# Altium footprint library lib_protel_HC_BOINA.PCBLIB: 726 footprints (part 44 of 46)
Each footprint in its own frame and in the unit in brackets; x right, y up, seen from the top. Pads: shape width x height; smd on the part's side, far side on the other; paste and mask are expansions set on the pad; w line width, h text height; cw(c..) or ccw(c..) is an arc to the next point about the centre after c.
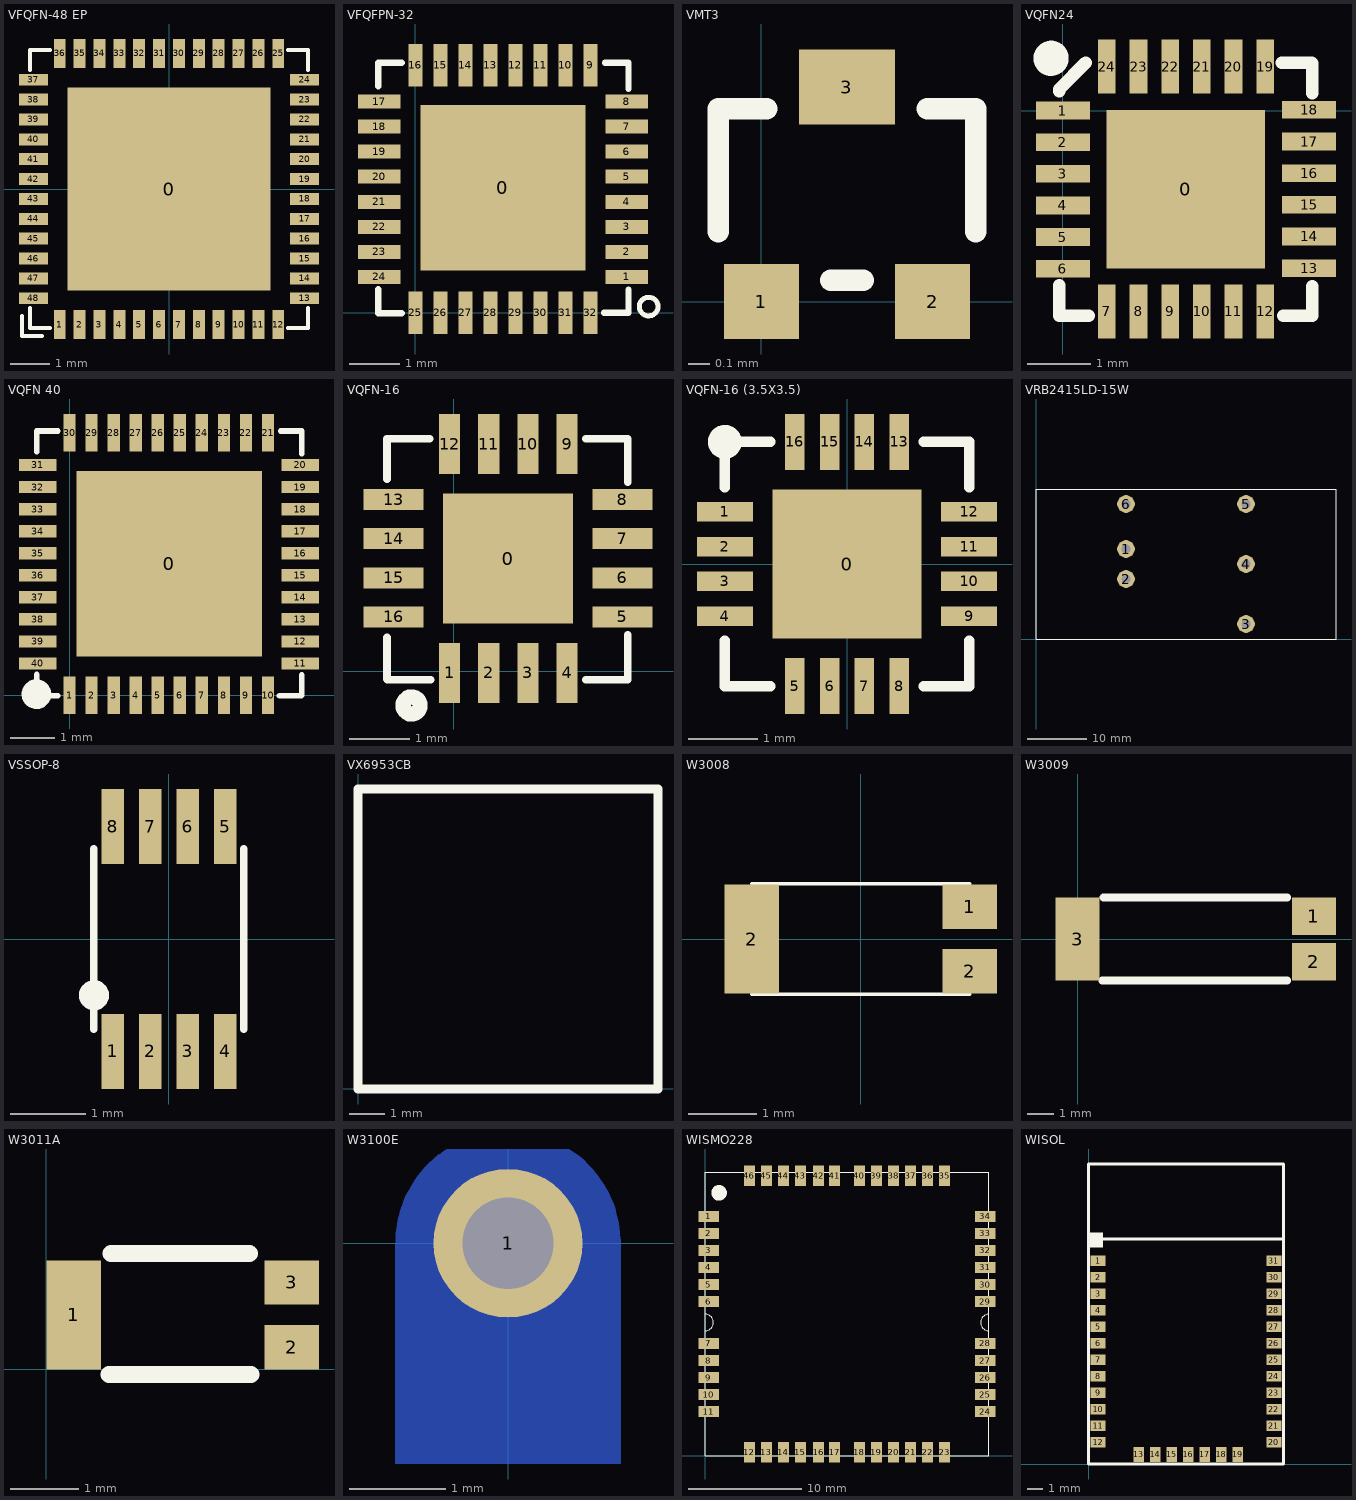
[diagram p43: the footprints below, top view; thin cyan lines are the x and y axes]

## VFQFN-48 EP [mm]
pads (49):
  rect 5.1x5.1 smd: 0(0,0)
  rect 0.3x0.725 smd: 1(-2.75,-3.413) 2(-2.25,-3.413) 3(-1.75,-3.413) 4(-1.25,-3.413) 5(-0.75,-3.413) 6(-0.25,-3.413) 7(0.25,-3.413) 8(0.75,-3.413) 9(1.25,-3.413) 10(1.75,-3.413) 11(2.25,-3.413) 12(2.75,-3.413) 25(2.75,3.413) 26(2.25,3.413) 27(1.75,3.413) 28(1.25,3.413) 29(0.75,3.413) 30(0.25,3.413) 31(-0.25,3.413) 32(-0.75,3.413) 33(-1.25,3.413) 34(-1.75,3.413) 35(-2.25,3.413) 36(-2.75,3.413)
  rect 0.725x0.3 smd: 13(3.413,-2.75) 14(3.413,-2.25) 15(3.413,-1.75) 16(3.413,-1.25) 17(3.413,-0.75) 18(3.413,-0.25) 19(3.413,0.25) 20(3.413,0.75) 21(3.413,1.25) 22(3.413,1.75) 23(3.413,2.25) 24(3.413,2.75) 37(-3.413,2.75) 38(-3.413,2.25) 39(-3.413,1.75) 40(-3.413,1.25) 41(-3.413,0.75) 42(-3.413,0.25) 43(-3.413,-0.25) 44(-3.413,-0.75) 45(-3.413,-1.25) 46(-3.413,-1.75) 47(-3.413,-2.25) 48(-3.413,-2.75)
Top Overlay:
  lines w0.1: -3.7,-3.2 -3.7,-3.7 -3.2,-3.7 ; -3.5,-3 -3.5,-3.5 -3,-3.5 ; -3.5,3 -3.5,3.5 -3,3.5 ; 3,-3.5 3.5,-3.5 3.5,-3 ; 3,3.5 3.5,3.5 3.5,3

## VFQFPN-32 [mm] "STRFNFCA"
height 1
pads (33):
  rect 3.3x3.3 smd: 0(1.75,2.5)
  rect 0.85x0.28 smd mask+0.07: 1(4.23,0.72) 2(4.23,1.22) 3(4.23,1.72) 4(4.23,2.22) 5(4.23,2.72) 6(4.23,3.22) 7(4.23,3.72) 8(4.23,4.22) 17(-0.72,4.22) 18(-0.72,3.72) 19(-0.72,3.22) 20(-0.72,2.72) 21(-0.72,2.22) 22(-0.72,1.72) 23(-0.72,1.22) 24(-0.72,0.72)
  rect 0.28x0.85 smd mask+0.07: 9(3.5,4.95) 10(3,4.95) 11(2.5,4.95) 12(2,4.95) 13(1.5,4.95) 14(1,4.95) 15(0.5,4.95) 16(0,4.95) 25(0,0) 26(0.5,0) 27(1,0) 28(1.5,0) 29(2,0) 30(2.5,0) 31(3,0) 32(3.5,0)
Top Overlay:
  circle w0.1: c4.663,0.125 r0.187
  lines w0.127: -0.74,0.47 -0.74,-0.01 -0.27,-0.01 ; -0.74,4.525 -0.74,4.995 ; -0.74,5 -0.27,5 ; 3.77,0 4.26,0 4.26,0.46 ; 3.79,4.995 4.26,4.995 4.26,4.475

## VMT3 [mm]
pads (3):
  rect 0.35x0.35 smd: 1(0,0) 2(0.8,0)
  rect 0.45x0.35 smd: 3(0.4,1)
Top Overlay:
  lines w0.1: -0.2,0.325 -0.2,0.9 0.025,0.9 ; 0.325,0.1 0.475,0.1 ; 0.775,0.9 1,0.9 1,0.325
3D body: height 0.5, standoff 0, extent -0.2,0.1 1,0.9

## VQFN24 [mm] "encapsulado para BQ24610"
height 1
pads (25):
  rect 2.5x2.5 smd mask+0: 0(1.94,-1.245)
  rect 0.85x0.28 smd: 1(0,0) 2(0,-0.5) 3(0,-1) 4(0,-1.5) 5(0,-2) 6(0,-2.5) 13(3.89,-2.49) 14(3.89,-1.99) 15(3.89,-1.49) 16(3.89,-0.99) 17(3.89,-0.49) 18(3.89,0.01)
  rect 0.28x0.85 smd: 7(0.695,-3.175) 8(1.195,-3.175) 9(1.695,-3.175) 10(2.195,-3.175) 11(2.695,-3.175) 12(3.195,-3.175) 19(3.195,0.695) 20(2.695,0.695) 21(2.195,0.695) 22(1.695,0.695) 23(1.195,0.695) 24(0.695,0.695)
Top Overlay:
  circle w0.381: c-0.187,0.825 r0.087
  lines w0.2: -0.06,-2.765 -0.06,-3.245 0.41,-3.245 ; -0.06,0.305 -0.06,0.335 0.36,0.755 ; 3.46,0.755 3.93,0.755 3.94,0.745 3.94,0.275 ; 3.48,-3.245 3.94,-3.245 3.94,-2.775

## VQFN 40 [mm] "CC2530"
height 1
pads (41):
  rect 4.2x4.2 smd: 0(2.26,2.98)
  rect 0.28x0.85 smd: 1(0,0) 2(0.5,0) 3(1,0) 4(1.5,0) 5(2,0) 6(2.5,0) 7(3,0) 8(3.5,0) 9(4,0) 10(4.5,0) 21(4.5,5.95) 22(4,5.95) 23(3.5,5.95) 24(3,5.95) 25(2.5,5.95) 26(2,5.95) 27(1.5,5.95) 28(1,5.95) 29(0.5,5.95) 30(0,5.95)
  rect 0.85x0.28 smd: 11(5.23,0.72) 12(5.23,1.22) 13(5.23,1.72) 14(5.23,2.22) 15(5.23,2.72) 16(5.23,3.22) 17(5.23,3.72) 18(5.23,4.22) 19(5.23,4.72) 20(5.23,5.22) 31(-0.72,5.22) 32(-0.72,4.72) 33(-0.72,4.22) 34(-0.72,3.72) 35(-0.72,3.22) 36(-0.72,2.72) 37(-0.72,2.22) 38(-0.72,1.72) 39(-0.72,1.22) 40(-0.72,0.72)
Top Overlay:
  circle w0.3: c-0.75,0.025 r0.187
  lines w0.127: -0.74,0.47 -0.74,-0.01 -0.27,-0.01 ; -0.74,5.52 -0.74,5.99 -0.27,5.99 ; 4.76,-0.01 5.25,-0.01 5.26,0 5.26,0.46 ; 4.79,5.99 5.26,5.99 5.26,5.47
3D body "User Library-QFN-40.STEP": height 1.05, standoff 0, extent -0.825,-0.1 5.325,6.05

## VQFN-16 [mm] "AMPLIFICADOR CC2591"
height 1
pads (17):
  rect 2.16x2.16 smd: 0(0.9,1.87)
  rect 0.35x1 smd mask+0.07: 1(-0.07,-0.03) 2(0.58,-0.03) 3(1.23,-0.03) 4(1.88,-0.03) 9(1.88,3.77) 10(1.23,3.77) 11(0.58,3.77) 12(-0.07,3.77)
  rect 1x0.35 smd mask+0.07: 5(2.8,0.9) 6(2.8,1.55) 7(2.8,2.2) 8(2.8,2.85) 13(-1,2.85) 14(-1,2.2) 15(-1,1.55) 16(-1,0.9)
Top Overlay:
  circle w0.254: c-0.701,-0.57 r0.141
  lines w0.127: -1.11,0.56 -1.11,-0.13 -1.1,-0.14 -0.38,-0.14 ; -1.11,3.19 -1.11,3.86 -0.4,3.86 ; 2.19,-0.14 2.89,-0.14 2.89,0.6 ; 2.19,3.86 2.89,3.86 2.89,3.14

## VQFN-16 (3.5X3.5) [mm]
height 0.9
pads (17):
  rect 2.14x2.14 smd mask+0.06: 0(0,0)
  rect 0.8x0.28 smd mask+0.06: 1(-1.75,0.75) 2(-1.75,0.25) 3(-1.75,-0.25) 4(-1.75,-0.75) 9(1.75,-0.75) 10(1.75,-0.25) 11(1.75,0.25) 12(1.75,0.75)
  rect 0.28x0.8 smd mask+0.06: 5(-0.75,-1.75) 6(-0.25,-1.75) 7(0.25,-1.75) 8(0.75,-1.75) 13(0.75,1.75) 14(0.25,1.75) 15(-0.25,1.75) 16(-0.75,1.75)
Top Overlay:
  circle w0.305: c-1.75,1.75 r0.09
  lines w0.15: -1.75,-1.1 -1.75,-1.75 -1.1,-1.75 ; -1.75,1.1 -1.75,1.75 -1.1,1.75 ; 1.1,-1.75 1.75,-1.75 1.75,-1.1 ; 1.1,1.75 1.75,1.75 1.75,1.1
3D body: height 0.9, standoff 0, extent -1.75,-1.75 1.75,1.75

## VRB2415LD-15W [mm]
pads (6):
  round 3 hole 1.5: 1(15.24,15.24) 2(15.24,10.16) 3(35.56,2.54) 4(35.56,12.7) 5(35.56,22.86) 6(15.24,22.86)
Top Overlay:
  lines w0.203: 0,0 50.8,0 50.8,25.4 0,25.4 0,0

## VSSOP-8 [mm]
pads (8):
  rect 0.3x1 smd: 1(-0.75,-1.5) 2(-0.25,-1.5) 3(0.25,-1.5) 4(0.75,-1.5) 5(0.75,1.5) 6(0.25,1.5) 7(-0.25,1.5) 8(-0.75,1.5)
Top Overlay:
  circle w0.203: c-1,-0.75 r0.1
  lines w0.1: -1,-1.2 -1,1.2 ; 1,-1.2 1,1.2

## VX6953CB [mm] "CAMARA"
height 4.6
Top Overlay:
  lines w0.254: 0,0 0,8.5 8.5,8.5 8.5,0 0.025,0 0,0.025

## W3008 [mm] "Antena Bluetooth WLAN WiFi"
height 1.1
pads (3):
  rect 0.8x0.65 smd: 1(1.6,0.475) 2(1.6,-0.475)
  rect 0.8x1.6 smd: 2(-1.6,0)
Top Overlay:
  lines w0.051: -1.6,-0.81 1.6,-0.81 ; -1.6,0.81 1.6,0.81

## W3009 [mm] "Antena Pulse GPS"
height 4
pads (3):
  rect 1.7x1.45 smd: 1(9.1,0.875) 2(9.1,-0.875)
  rect 1.7x3.2 smd: 3(0,0)
Top Overlay:
  lines w0.3: 0.95,-1.6 8.075,-1.6 ; 1,1.6 8.075,1.6

## W3011A [mm] "GPS Pasive Antenna"
height 1.1
pads (3):
  rect 0.8x1.6 smd: 1(0.4,0.8)
  rect 0.8x0.65 smd: 2(3.6,0.325) 3(3.6,1.275)
Top Overlay:
  lines w0.254: 0.925,-0.075 3,-0.075 ; 0.95,1.7 2.975,1.7
3D body: height 1.1, standoff 1.05, extent 1.75,0 3.6,1.6
3D body: height 1.1, standoff 1.05, extent 0.4,0 2.25,1.6
3D body: height 1.05, standoff 0, extent 0.4,0 3.6,1.6

## W3100E [mm] "Pulse vertical helix antenna"
pads (1):
  round 1.55 hole 0.95: 1(0,0)
Bottom Layer:
  circle w0.7: c0,0 r0.825
  rectangle: -1.175,-2.3 1.175,0

## WISMO228 [mm] "MODEM GSM/GPRS WISMO 228"
height 2.8
pads (46):
  rect 1.8x1 smd: 1(0.3,21.1) 2(0.3,19.6) 3(0.3,18.1) 4(0.3,16.6) 5(0.3,15.1) 6(0.3,13.6) 7(0.3,9.9) 8(0.3,8.4) 9(0.3,6.9) 10(0.3,5.4) 11(0.3,3.9) 24(24.7,3.9) 25(24.7,5.4) 26(24.7,6.9) 27(24.7,8.4) 28(24.7,9.9) 29(24.7,13.6) 30(24.7,15.1) 31(24.7,16.6) 32(24.7,18.1) 33(24.7,19.6) 34(24.7,21.1)
  rect 1x1.8 smd: 12(3.9,0.3) 13(5.4,0.3) 14(6.9,0.3) 15(8.4,0.3) 16(9.99,0.3) 17(11.4,0.3) 18(13.6,0.3) 19(15.1,0.3) 20(16.6,0.3) 21(18.1,0.3) 22(19.6,0.3) 23(21.1,0.3) 35(21.1,24.7) 36(19.6,24.7) 37(18.1,24.7) 38(16.6,24.7) 39(15.1,24.7) 40(13.6,24.7) 41(11.4,24.7) 42(9.99,24.7) 43(8.4,24.7) 44(6.9,24.7) 45(5.4,24.7) 46(3.9,24.7)
Top Overlay:
  circle w0.762: c1.225,23.18 r0.305
  lines w0.051: 25,11.027 cw(c25,11.75) 25,12.472
  lines w0.08: 0,11.028 ccw(c0,11.75) 0,12.472 ; 0,0 25,0 25,25 0,25 0,0

## WISOL [mm]
height 1.1
pads (31):
  rect 1x0.7 smd: 1(0.64,13.55) 2(0.64,12.45) 3(0.64,11.35) 4(0.64,10.25) 5(0.64,9.15) 6(0.64,8.05) 7(0.64,6.95) 8(0.64,5.85) 9(0.64,4.75) 10(0.64,3.65) 11(0.64,2.55) 12(0.64,1.45) 20(12.36,1.45) 21(12.36,2.55) 22(12.36,3.65) 23(12.36,4.75) 24(12.36,5.85) 25(12.36,6.95) 26(12.36,8.05) 27(12.36,9.15) 28(12.36,10.25) 29(12.36,11.35) 30(12.36,12.45) 31(12.36,13.55)
  rect 0.7x1 smd: 13(3.34,0.64) 14(4.44,0.64) 15(5.54,0.64) 16(6.64,0.64) 17(7.74,0.64) 18(8.84,0.64) 19(9.94,0.64)
Top Overlay:
  rectangle: 0,14.45 0.95,15.45
  lines w0.2: 0,15 13,15 ; 0,0 13,0 13,20 0,20 0,0
3D body: height 2.21, standoff 0, extent 0,0 13,20